# Altium footprint library Connectors.PcbLib: 97 footprints (part 3 of 7)
Each footprint in its own frame and in the unit in brackets; x right, y up, seen from the top. Pads: shape width x height; smd on the part's side, far side on the other; paste and mask are expansions set on the pad; w line width, h text height; cw(c..) or ccw(c..) is an arc to the next point about the centre after c.
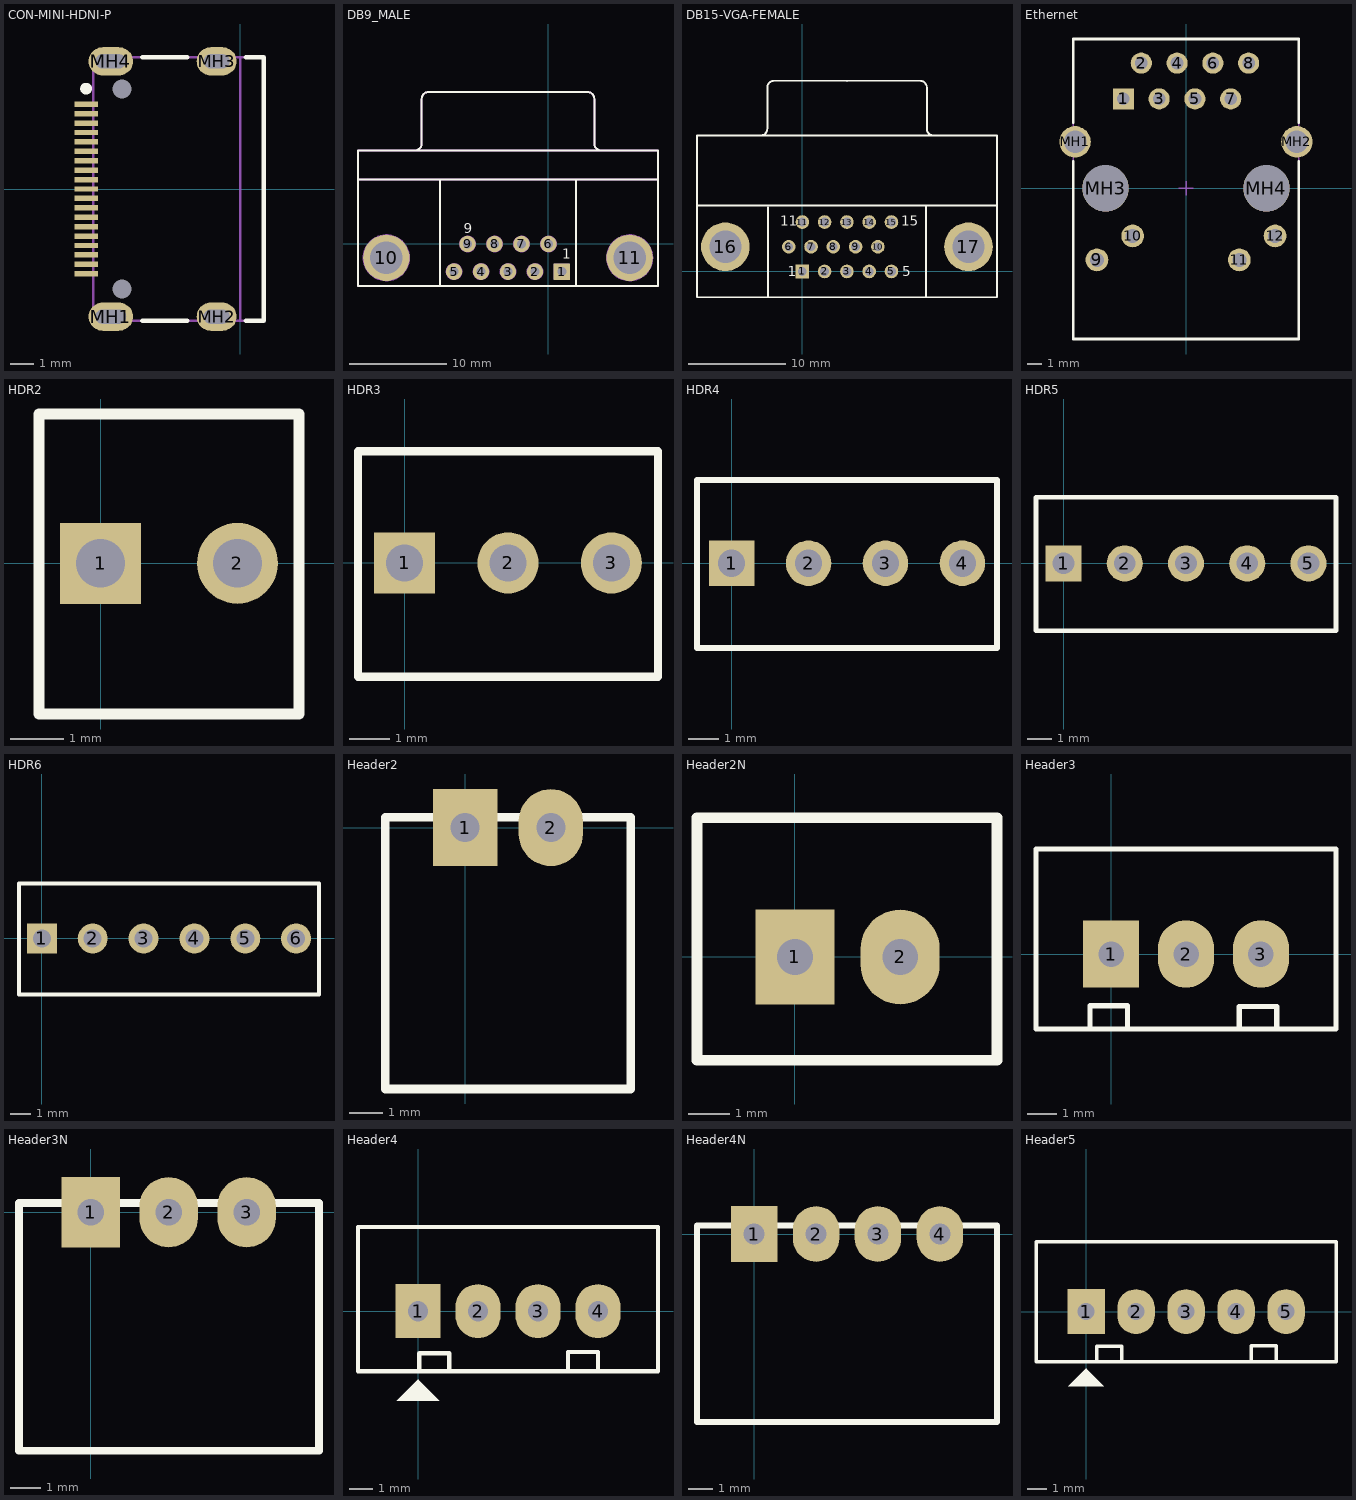
[diagram p2: the footprints below, top view; thin cyan lines are the x and y axes]

## CON-MINI-HDNI-P [mm] "Connector; mini-HDMI, SM, 19 Position, Right Angle, Body 7.9 x 11.2 x 3.3 mm (LxWxH), post"
height 3.3
pads (25):
  rect 1x0.23 smd: 1(-6.55,3.6) 2(-6.55,3.2) 3(-6.55,2.8) 4(-6.55,2.4) 5(-6.55,2) 6(-6.55,1.6) 7(-6.55,1.2) 8(-6.55,0.8) 9(-6.55,0.4) 10(-6.55,0) 11(-6.55,-0.4) 12(-6.55,-0.8) 13(-6.55,-1.2) 14(-6.55,-1.6) 15(-6.55,-2) 16(-6.55,-2.4) 17(-6.55,-2.8) 18(-6.55,-3.2) 19(-6.55,-3.6)
  oval 1.9x1.2 hole 0.6 slot 1.3 at 0 deg: MH1(-5.5,-5.425) MH4(-5.5,5.425)
  oval 1.7x1.2 hole 0.6 slot 1.1 at 0 deg: MH2(-1,-5.425) MH3(-1,5.425)
  round 0.5 hole 0.8 unplated: MH5(-5.025,-4.25) MH6(-5.025,4.25)
Top Overlay:
  circle w0.25: c-6.55,4.265 r0.125
  lines w0.2: -4.15,-5.6 -2.25,-5.6 ; -4.15,5.6 -2.25,5.6 ; 0.25,-5.6 1,-5.6 1,5.6 0.25,5.6
Mechanical 1:
  lines w0.1: 0,-5.6 0,5.6
  text "PCB Edge" at -0.3,-4.725 h0.25
Mechanical 13:
  lines w0.1: -6.25,-5.6 -6.25,5.6 1,5.6 1,-5.6 -6.25,-5.6
3D body "685119136923.stp": height 1.8, standoff -3.65, extent -6.865,-5.6 1.035,5.6

## DB9_MALE [mm]
height 1
pads (11):
  rect 1.69x1.69 hole 0.9: 1(1.385,-2.84)
  round 1.69 hole 0.9: 2(-1.385,-2.84) 3(-4.155,-2.84) 4(-6.925,-2.84) 6(0,0) 7(-2.77,0) 8(-5.54,0) 9(-8.31,0)
  round 1.69 hole 0.9 mask+0: 5(-9.695,-2.84)
  round 4.76 hole 3.3: 10(-16.65,-1.42) 11(8.34,-1.42)
Top Overlay:
  lines w0.2: -19.555,6.604 11.245,6.604 ; -13.715,9.609 ccw(c-13.715,10.304) -13.02,10.304 -13.02,14.904 ; -13.015,14.909 cw(c-12.32,14.909) -12.32,15.604 4.01,15.604 cw(c4.01,14.909) 4.705,14.909 ; -11.155,-4.32 -11.155,6.604 ; 2.845,-4.32 2.845,6.604 ; 4.71,14.904 4.71,10.304 ccw(c5.405,10.304) 5.405,9.609 ; -19.555,-4.32 11.245,-4.32 11.245,9.604 -19.555,9.604 -19.555,-4.32
  text "9" at -8.709,1.095 h1
  text "1" at 1.4,-1.5 h1
Mechanical 7:
  circle w0.2: c-16.65,-1.42 r2.327
  circle w0.2: c8.34,-1.42 r2.327
  circle w0.2: c0,0 r0.773
  circle w0.2: c-2.77,0 r0.773
  circle w0.2: c-5.54,0 r0.773
  circle w0.2: c-8.31,0 r0.773
  circle w0.2: c-9.695,-2.84 r0.773
  circle w0.2: c-6.925,-2.84 r0.773
  circle w0.2: c-4.155,-2.84 r0.773
  circle w0.2: c-1.385,-2.84 r0.773
  lines w0.2: -19.555,6.604 11.245,6.604 ; -13.715,9.609 ccw(c-13.715,10.304) -13.02,10.304 -13.02,14.904 ; -13.015,14.909 cw(c-12.32,14.909) -12.32,15.604 4.01,15.604 cw(c4.01,14.909) 4.705,14.909 ; -11.155,-4.32 -11.155,6.604 ; 2.845,-4.32 2.845,6.604 ; 4.71,14.904 4.71,10.304 ccw(c5.405,10.304) 5.405,9.609 ; -19.555,-4.32 -19.555,9.604 11.245,9.604 11.245,-4.32 -19.555,-4.32 ; 0.635,-3.59 0.635,-2.84 0.635,-2.09 2.135,-2.09 2.135,-3.59 0.635,-3.59
3D body: height 4.5, standoff 4, extent -18.528,-1.113 -14.985,5.568
3D body: height 4.5, standoff 4, extent 6.626,-0.892 10.169,5.789
3D body: height 4, standoff -3, extent 8.804,-1.354 9.749,-0.899
3D body: height 4, standoff -3, extent 6.914,-1.537 7.981,-0.808
3D body: height 4, standoff -3, extent -16.299,-1.641 -15.232,-0.912
3D body: height 4, standoff -3, extent -18.067,-1.549 -17.122,-1.095
3D body "SW3DPS-DB9RA_copy.STEP": height 12.66, standoff -3.39, extent -19.848,-4.328 11.466,16.376

## DB15-VGA-FEMALE [mm]
pads (17):
  rect 1.4x1.4 hole 0.9: 1(0,0)
  round 1.4 hole 0.9: 2(2.29,0) 3(4.58,0) 4(6.87,0) 9(5.47,2.54) 11(0,5.08) 12(2.29,5.08) 13(4.58,5.08) 14(6.87,5.08) 15(9.16,5.08)
  round 1.4 hole 0.9 mask+0: 5(9.16,0) 6(-1.4,2.54) 7(0.89,2.54) 8(3.18,2.54) 10(7.76,2.54)
  round 5 hole 3.3: 16(-7.915,2.54) 17(17.075,2.54)
Top Overlay:
  lines w0.2: -10.83,6.77 20.01,6.77 ; -4.3,13.975 ccw(c-4.3,14.67) -3.605,14.67 -3.605,18.91 cw(c-2.91,18.91) -2.91,19.605 4.595,19.59 12.1,19.605 cw(c12.1,18.91) 12.795,18.91 12.795,14.67 ccw(c13.49,14.67) 13.49,13.975 ; -3.535,-2.65 -3.535,6.57 ; 12.725,-2.65 12.725,6.65 ; -10.83,-2.65 20.01,-2.65 20.01,13.97 -10.83,13.97 -10.83,-2.65
  text "1" at -1.524,-0.508 h1
  text "11" at -2.286,4.699 h1
  text "5" at 10.287,-0.508 h1
  text "15" at 10.16,4.699 h1
3D body "SW3dPS-vga connector.STEP": height 14.3, standoff -0.79, extent -12.272,14.986 21.416,60.116
3D body "DB15 Analog RGB.stp": height 12.75, standoff -3.75, extent -10.935,-1.672 20.065,20.828

## Ethernet [mm] "Connector; PCB Jack, Thru-Hole; 1-Port, 8 Positions, 8 Loaded; Shielded without Lightpipes; Vertical"
height 16.5
pads (16):
  rect 1.5x1.5 hole 0.9: 1(-4.445,6.35)
  round 1.5 hole 0.9: 2(-3.175,8.89) 3(-1.905,6.35) 4(-0.635,8.89) 5(0.635,6.35) 6(1.905,8.89) 7(3.175,6.35)
  round 1.5 hole 0.9 mask+0: 8(4.445,8.89)
  round 1.62 hole 1: 9(-6.325,-5.08) 11(3.785,-5.08) 12(6.325,-3.38)
  round 1.62 hole 1 mask+0: 10(-3.785,-3.38)
  round 2.23 hole 1.6: MH1(-7.875,3.3) MH2(7.875,3.3)
  round 3.3 hole 3.3 unplated: MH3(-5.715,0) MH4(5.715,0)
Top Overlay:
  lines w0.2: -8,1.905 -8,-10.7 8,-10.7 8,1.905 ; -8,4.665 -8,10.6 8,10.6 8,4.665
Mechanical 13:
  lines w0.1: -8,-10.7 -8,10.6 8,10.6 8,-10.7 -8,-10.7
Mechanical 15:
  lines w0.1: -0.5,0 0.5,0 ; 0,-0.5 0,0.5
3D body "RJ45cat5step.stp": height 24.61, standoff -2.07, extent -6.043,-145.273 5.637,2.095
3D body "alteredRJstep.STEP": height 13.14, standoff -3.9, extent -7.897,-10.71 7.968,10.601

## HDR2 [mm] "Connector; Header; 2 Position"
pads (2):
  rect 1.5x1.5 hole 0.9: 1(0,0)
  round 1.5 hole 0.9: 2(2.54,0)
Top Overlay:
  lines w0.2: -1.143,-2.794 3.683,-2.794 3.683,2.769 -1.143,2.769 -1.143,-2.794
3D body "h2.stp": height 11.72, standoff -3.54, extent -1.27,-2.92 3.81,2.88

## HDR3 [mm] "Connector; Header; 3 Position"
pads (3):
  rect 1.5x1.5 hole 0.9: 1(0,0)
  round 1.5 hole 0.9: 2(2.54,0) 3(5.08,0)
Top Overlay:
  lines w0.2: -1.143,-2.794 -1.143,2.743 6.223,2.743 6.223,-2.794 -1.143,-2.794
3D body "h3.stp": height 11.72, standoff -3.54, extent -1.27,-2.92 6.35,2.88

## HDR4 [mm] "Connector; Header; 4 Position"
pads (4):
  rect 1.5x1.5 hole 0.9: 1(0,0)
  round 1.5 hole 0.9: 2(2.54,0) 3(5.08,0) 4(7.62,0)
Top Overlay:
  lines w0.2: -1.143,-2.794 -1.143,2.743 8.763,2.743 8.763,-2.794 -1.143,-2.794
3D body "h4.stp": height 11.72, standoff -3.54, extent -1.27,-2.92 8.89,2.88

## HDR5 [mm] "Connector; Header; 5 Position"
pads (5):
  rect 1.5x1.5 hole 0.9: 1(0,0)
  round 1.5 hole 0.9: 2(2.54,0) 3(5.08,0) 4(7.62,0) 5(10.16,0)
Top Overlay:
  lines w0.2: -1.143,-2.794 11.303,-2.794 11.303,2.743 -1.143,2.743 -1.143,-2.794
3D body "h5.stp": height 11.72, standoff -3.54, extent -1.27,-2.92 11.43,2.88

## HDR6 [mm] "Connector; Header; 6 Position"
pads (6):
  rect 1.5x1.5 hole 0.9: 1(0,0)
  round 1.5 hole 0.9: 2(2.54,0) 3(5.08,0) 4(7.62,0) 5(10.16,0) 6(12.7,0)
Top Overlay:
  lines w0.2: -1.143,-2.794 13.843,-2.794 13.843,2.743 -1.143,2.743 -1.143,-2.794
3D body "h6.stp": height 11.72, standoff -3.54, extent -1.27,-2.92 13.97,2.88

## Header2 [mil] "CON2"
height 200
pads (2):
  rect 75x90 hole 34: 1(0,0)
  oval 75x90 hole 34: 2(100,0)
Top Overlay:
  lines w10: -93,-305 193,-305 193,12 -93,12 -93,-305
3D body "JST - XH - Thru R - 2Pin - 2.54mm.stp": height 230, standoff -133, extent -92,-304.47 192,11.92

## Header2N [mil] "CON2"
height 200
pads (2):
  rect 75x90 hole 34: 1(0,0)
  oval 75x90 hole 34: 2(100,0)
Top Overlay:
  lines w10: -93,-98 192,-98 192,132 -93,132 -93,-98
3D body "JST - XH - Thru V - 2Pin - 2.54mm.stp": height 284, standoff -118, extent -92.39,-98 191.61,132

## Header3 [mil] "CON 3"
height 200
pads (3):
  rect 75x90 hole 34: 1(0,0)
  oval 75x90 hole 34: 2(100,0) 3(200,0)
Top Overlay:
  lines w7: -28,-99 -28,-69 22,-69 22,-99 ; 171,-100 171,-70 221,-70 221,-100 ; -100,-100 300,-100 300,0 300,140 -100,140 -100,-100
3D body "SW3dPS-jst-b3b-xh-a.STEP": height 275.59, standoff -133.86, extent -94.88,-90 294.88,136.38

## Header3N [mil] "CON 3"
height 200
pads (3):
  rect 75x90 hole 34: 1(0,0)
  oval 75x90 hole 34: 2(100,0) 3(200,0)
Top Overlay:
  lines w10: -92,-306 293,-306 293,12 -92,12 -92,-306
3D body "JST - XH - Thru R - 3Pin - 2.54mm.stp": height 230, standoff -133, extent -92,-304.47 292,11.92

## Header4 [mil] "CON4"
height 200
pads (4):
  rect 75x90 hole 34: 1(0,0)
  oval 75x90 hole 34: 2(100,0) 3(200,0) 4(300,0)
Top Overlay:
  region: -35.5,-149.5 35.5,-149.5 0.5,-114.5 0.5,-113.5
  lines w7: 2,-100 2,-70 52,-70 52,-100 ; 250,-98 250,-68 300,-68 300,-98 ; -100,-100 -100,140 400,140 400,0 400,-100 -100,-100
3D body "User Library-XH2_54-4P_step.step": height 275.59, standoff -70.87, extent -91.97,-90.99 400.16,137.36

## Header4N [mil] "CON4"
height 200
pads (4):
  rect 75x90 hole 34: 1(0,0)
  oval 75x90 hole 34: 2(100,0) 3(200,0) 4(300,0)
Top Overlay:
  lines w10: -92,-303 392,-303 392,14 -92,14 -92,-303
3D body "JST - XH - Thru R - 4Pin - 2.54mm.stp": height 230, standoff -133, extent -92,-302.5 392,13.89

## Header5 [mil] "CON5"
height 200
pads (5):
  rect 75x90 hole 34: 1(0,0)
  oval 75x90 hole 34: 2(100,0) 3(200,0) 4(300,0) 5(400,0)
Top Overlay:
  region: -35.5,-149.5 35.5,-149.5 0.5,-114.5 0.5,-113.5
  lines w7: 21,-99 21,-69 71,-69 71,-99 ; 330,-98 330,-68 380,-68 380,-98 ; -100,-100 500,-100 500,0 500,140 -100,140 -100,-100
3D body "User Library-XH2_54-5P-1.step": height 275.59, standoff -70.87, extent -96.06,-94.49 496.07,133.86